# Altium schematic symbol library 13-Logic 数字 IC.SchLib: 324 symbols (part 3 of 30) (continued)
## 5AGXMB1G4F40C4N_Pin Name Avec Pin Number (continued)
part H pins: A20 IO_8D_A20/FPLL_TC_CLKOUT2,FPLL_TC_FBP,FPLL_TC_FB1/DIFFIO_RX_T89P/DQS12T/CQ12T/CQN12T/QKN12T (io), A23 IO_8D_A23/DIFFIO_TX_T95P/DQ13T (io), A24 IO_8D_A24/DIFFIO_TX_T95N (io), A25 IO_8C_A25/DIFFIO_RX_T112P/DQS15T/CQ15T/CQN15T/QKN15T (io), A26 IO_8C_A26/DIFFIO_TX_T118P/DQ16T (io), A27 IO_8C_A27/DIFFIO_TX_T118N (io), B21 IO_8D_B21/FPLL_TC_CLKOUT3,FPLL_TC_FBN/DIFFIO_RX_T89N/DQSN12T/QK12T (io), B24 IO_8D_B24/DIFFIO_RX_T102P/DQ14T (io), B25 IO_8C_B25/DIFFIO_RX_T112N/DQSN15T/QK15T (io), B27 IO_8C_B27/DIFFIO_RX_T125P/DQ17T (io), C23 IO_8D_C23/DIFFIO_RX_T96P/DQS13T/CQ13T/CQN13T/QKN13T (io), C24 IO_8D_C24/DIFFIO_RX_T102N/DQ14T (io), C26 IO_8C_C26/DIFFIO_RX_T116P/DQ16T (io), C27 IO_8C_C27/DIFFIO_RX_T125N/DQ17T (io), D21 IO_8D_D21/DIFFIO_TX_T88P/DQ12T (io), D23 IO_8D_D23/DIFFIO_RX_T96N/DQSN13T/QK13T (io), D24 IO_8D_D24/DIFFIO_RX_T104P/DQS14T/CQ14T/CQN14T/QKN14T (io), D25 IO_8C_D25/DIFFIO_RX_T114P/DQ15T (io), D26 IO_8C_D26/DIFFIO_RX_T116N/DQ16T (io), E21 IO_8D_E21/DIFFIO_TX_T88N (io), E22 IO_8D_E22/DIFFIO_RX_T94P/DQ13T (io), E24 IO_8D_E24/DIFFIO_RX_T104N/DQSN14T/QK14T (io), E25 IO_8C_E25/DIFFIO_RX_T114N/DQ15T (io), E27 IO_8C_E27/DIFFIO_TX_T126P/DQ17T (io), F22 IO_8D_F22/DIFFIO_RX_T94N/DQ13T (io), F23 IO_8D_F23/DIFFIO_RX_T100P/DQ14T (io), F24 IO_8D_F24/DIFFIO_RX_T106P/DQ14T (io), F26 IO_8C_F26/DIFFIO_RX_T121P/DQ16T (io), F27 IO_8C_F27/DIFFIO_TX_T126N (io), G23 IO_8D_G23/DIFFIO_RX_T100N/DQ14T (io), G24 IO_8D_G24/DIFFIO_RX_T106N/DQ14T (io), G25 IO_8C_G25/DIFFIO_TX_T109P/DQ15T (io), G26 IO_8C_G26/DIFFIO_RX_T121N/DQ16T (io), H24 IO_8D_H24/DIFFIO_TX_T107P/DQ14T (io), H25 IO_8C_H25/DIFFIO_TX_T109N (io), H27 IO_8C_H27/DIFFIO_TX_T124P/DQ17T (io), J21 IO_8D_J21/FPLL_TC_CLKOUT0,FPLL_TC_CLKOUTP,FPLL_TC_FB0/DIFFIO_TX_T90P/DQ12T (io), J22 IO_8D_J22/DQ13T (io), J23 IO_8D_J23/DIFFIO_TX_T105P/DQ14T (io), J24 IO_8D_J24/DIFFIO_TX_T107N (io), J26 IO_8C_J26/DIFFIO_TX_T120P/DQ16T (io), J27 IO_8C_J27/DIFFIO_TX_T124N (io), K21 IO_8D_K21/FPLL_TC_CLKOUT1,FPLL_TC_CLKOUTN/DIFFIO_TX_T90N (io), K23 IO_8D_K23/DIFFIO_TX_T105N (io), K24 IO_8C_K24/DIFFIO_TX_T113P/DQ15T (io), K25 IO_8C_K25/DQ16T (io), K26 IO_8C_K26/DIFFIO_TX_T120N (io), K27 IO_8C_K27/DIFFIO_TX_T128P/DQ17T (io), L22 IO_8D_L22/DIFFIO_TX_T97P/DQ13T (io), L24 IO_8C_L24/DIFFIO_TX_T113N (io), L27 IO_8C_L27/DIFFIO_TX_T128N (io), M21 IO_8D_M21/DIFFIO_TX_T86P/DQ12T (io), M22 IO_8D_M22/DIFFIO_TX_T97N (io), M23 IO_8D_M23/DIFFIO_TX_T103P/DQ14T (io), M25 IO_8C_M25/DIFFIO_TX_T122P/DQ16T (io), M26 IO_8C_M26/DIFFIO_RX_T119P/DQS16T/CQ16T/CQN16T/QKN16T (io), M27 IO_8C_M27/DIFFIO_RX_T129P/DQ17T (io), N21 IO_8D_N21/DIFFIO_TX_T86N (io), N22 IO_8D_N22/DIFFIO_RX_T98P/DQ13T (io), N23 IO_8D_N23/DIFFIO_TX_T103N (io), N24 IO_8C_N24/DIFFIO_RX_T110P/DQ15T (io), N25 IO_8C_N25/DIFFIO_TX_T122N (io), N26 IO_8C_N26/DIFFIO_RX_T119N/DQSN16T/QK16T (io), N27 IO_8C_N27/DIFFIO_RX_T129N/DQ17T (io), N28 IO_8C_N28/DIFFIO_TX_T130P/DQ17T (io), P22 IO_8D_P22/DIFFIO_RX_T98N/DQ13T (io), P24 IO_8C_P24/DIFFIO_RX_T110N/DQ15T (io), P25 IO_8C_P25/DIFFIO_TX_T115P/DQ15T (io), P27 IO_8C_P27/DIFFIO_RX_T123P/DQ17T (io), P28 IO_8C_P28/DIFFIO_TX_T130N (io), R21 IO_8D_R21/DIFFIO_TX_T92P/DQ12T (io), R22 IO_8D_R22/DIFFIO_TX_T99P/DQ13T (io), R23 IO_8D_R23/DIFFIO_TX_T101P/DQ14T (io), R24 IO_8C_R24/DIFFIO_TX_T111P/DQ15T (io), R25 IO_8C_R25/DIFFIO_TX_T115N (io), R26 IO_8C_R26/DIFFIO_RX_T117P/DQ16T (io), R27 IO_8C_R27/DIFFIO_RX_T123N/DQ17T (io), R28 IO_8C_R28/DIFFIO_RX_T127P/DQS17T/CQ17T/CQN17T/QKN17T (io), T21 IO_8D_T21/DIFFIO_TX_T92N (io), T22 IO_8D_T22/DIFFIO_TX_T99N (io), T23 IO_8D_T23/DIFFIO_TX_T101N (io), T24 IO_8C_T24/DIFFIO_TX_T111N (io), T25 IO_8C_T25/DIFFIO_RX_T108N/DQ15T (io), T26 IO_8C_T26/DIFFIO_RX_T108P/DQ15T (io), T27 IO_8C_T27/DIFFIO_RX_T117N/DQ16T (io), T28 IO_8C_T28/DIFFIO_RX_T127N/DQSN17T/QK17T (io)
part I pins: AF18 VREFB4DN0 (io), AG15 VREFB4CN0 (io), AH7 VREFB4AN0 (io), AJ21 VREFB3DN0 (io), AJ31 VREFB3AN0 (io), AK26 VREFB3CN0 (io), AL28 VREFB3BN0 (io), AN11 VREFB4BN0 (io), D15 VREFB7CN0 (io), G11 VREFB7BN0 (io), H22 VREFB8DN0 (io), H33 VREFB8AN0 (io), J7 VREFB7AN0 (io), L25 VREFB8CN0 (io), R31 VREFB8BN0 (io), T18 VREFB7DN0 (io)
part J pins: A6 CLK13P_A6/DIFFIO_RX_T3P/DQ1T (io), A21 CLK17N_A21/DIFFIO_RX_T91N/DQ12T (io), A22 CLK17P_A22/DIFFIO_RX_T91P/DQ12T (io), AC21 CLK6N_AC21/DIFFIO_RX_B82N/DQ11B (io), AD20 CLK6P_AD20/DIFFIO_RX_B82P/DQ11B (io), AE21 CLK5N_AE21/DIFFIO_RX_B78N/DQ11B (io), AF21 CLK5P_AF21/DIFFIO_RX_B78P/DQ11B (io), AJ7 CLK11N_AJ7/DIFFIO_RX_B160N/DQ21B (io), AJ34 CLK1N_AJ34/DIFFIO_RX_B4N/DQSN1B/QK1B (io), AK7 CLK11P_AK7/DIFFIO_RX_B160P/DQ21B (io), AK20 CLK7N_AK20/DIFFIO_RX_B84N/DQ11B (io), AK34 CLK1P_AK34/DIFFIO_RX_B4P/DQS1B/CQ1B/CQN1B/QKN1B (io), AL20 CLK7P_AL20/DIFFIO_RX_B84P/DQ11B (io), AL33 CLK2N_AL33/DIFFIO_RX_B7N/DQ1B (io), AM33 CLK2P_AM33/DIFFIO_RX_B7P/DQ1B (io), AN34 CLK0N_AN34/DIFFIO_RX_B2N/DQ1B (io), AP6 CLK8N_AP6/DIFFIO_RX_B168N/DQ22B (io), AP34 CLK0P_AP34/DIFFIO_RX_B2P/DQ1B (io), AR6 CLK8P_AR6/DIFFIO_RX_B168P/DQ22B (io), AR7 CLK10N_AR7/DIFFIO_RX_B164N/DQSN22B/QK22B (io), AT7 CLK10P_AT7/DIFFIO_RX_B164P/DQS22B/CQ22B/CQN22B/QKN22B (io), AT32 CLK3N_AT32/DIFFIO_RX_B9N/DQ2B (io), AU19 CLK4N_AU19/DIFFIO_RX_B76N/DQ10B (io), AU32 CLK3P_AU32/DIFFIO_RX_B9P/DQ2B (io), AV4 CLK9N_AV4/DIFFIO_RX_B166N/DQ22B (io), AV19 CLK4P_AV19/DIFFIO_RX_B76P/DQ10B (io), AW4 CLK9P_AW4/DIFFIO_RX_B166P/DQ22B (io), B6 CLK13N_B6/DIFFIO_RX_T3N/DQ1T (io), B22 CLK16P_B22/DIFFIO_RX_T93P/DQ13T (io), C6 CLK12P_C6/DIFFIO_RX_T1P/DQ1T (io), C20 CLK19P_C20/DIFFIO_RX_T85P/DQ12T (io), C22 CLK16N_C22/DIFFIO_RX_T93N/DQ13T (io), C34 CLK20P_C34/DIFFIO_RX_T167P/DQ22T (io), D6 CLK12N_D6/DIFFIO_RX_T1N/DQ1T (io), D20 CLK19N_D20/DIFFIO_RX_T85N/DQ12T (io), D34 CLK20N_D34/DIFFIO_RX_T167N/DQ22T (io), E6 CLK14P_E6/DIFFIO_RX_T5P/DQS1T/CQ1T/CQN1T/QKN1T (io), E7 CLK14N_E7/DIFFIO_RX_T5N/DQSN1T/QK1T (io), E34 CLK22P_E34/DIFFIO_RX_T162P/DQ22T (io), F34 CLK22N_F34/DIFFIO_RX_T162N/DQ22T (io), G21 CLK18P_G21/DIFFIO_RX_T87P/DQ12T (io), G34 CLK21P_G34/DIFFIO_RX_T165P/DQS22T/CQ22T/CQN22T/QKN22T (io), H6 CLK15P_H6/DIFFIO_RX_T9P/DQ2T (io), H21 CLK18N_H21/DIFFIO_RX_T87N/DQ12T (io), H34 CLK21N_H34/DIFFIO_RX_T165N/DQSN22T/QK22T (io), J6 CLK15N_J6/DIFFIO_RX_T9N/DQ2T (io), N33 CLK23N_N33/DIFFIO_RX_T160N/DQ21T (io), N34 CLK23P_N34/DIFFIO_RX_T160P/DQ21T (io)
part K pins: A34 MSEL1 (io), A36 NCONFIG (io), A37 MSEL3 (io), AE11 4A_DATA6/DIFFIO_RX_B155P/DQ21B (io), AF10 4A_DATA5/DIFFIO_RX_B155N/DQ21B (io), AH6 4A_DATA7/DIFFIO_RX_B157N/DQSN21B/QK21B (io), AH9 4A_DATA14/DIFFIO_TX_B158N (io), AH10 4A_DATA10/DIFFIO_TX_B154N (io), AJ6 4A_DATA8/DIFFIO_RX_B157P4A_/DQS21B/CQ21B/CQN21B/QKN21B (io), AJ9 4A_DATA15/DIFFIO_TX_B158P/DQ21B (io), AJ10 4A_DATA11/DIFFIO_TX_B154P/DQ21B (io), AK6 4A_DATA12/DIFFIO_TX_B156N (io), AL6 4A_DATA13/DIFFIO_TX_B156P/DQ21B (io), AM6 4A_DATA9/DIFFIO_RX_B159N/DQ21B (io), AM35 TMS (io), AN6 CLKUSR/DIFFIO_RX_B159P/DQ21B (io), AR33 3A_AS_DATA2/DATA2 (io), AR34 3A_NCSO/DATA4 (io), AT33 TDI (io), AT34 TDO (io), AU33 3A_AS_DATA1/DATA1 (io), AU34 3A_AS_DATA3/DATA3 (io), AV33 3A_AS_DATA0,ASDO/DATA0 (io), AV34 TCK (io), AW34 DCLK (io), D35 MSEL2 (io), F35 NSTATUS (io), H35 MSEL0 (io), K6 DEV_OE/DIFFIO_RX_T10P/DQ2T (io), K35 CONF_DONE (io), L6 DEV_CLRN/DIFFIO_RX_T10N/DQ2T (io), L7 PR_DONE/DIFFIO_TX_T13P/DQ2T (io), L10 PR_ERROR/DIFFIO_TX_T15P/DQ2T (io), M6 PR_REQUEST/DIFFIO_TX_T13N (io), M7 INIT_DONE/DIFFIO_RX_T14P/DQ2T (io), M10 PR_READY/DIFFIO_TX_T15N (io), M35 NCE (io), N7 NCEO/DIFFIO_RX_T14N/DQ2T (io), N9 NPERSTL0/DIFFIO_TX_T11N (io), P9 CRC_ERROR/DIFFIO_RX_T12N/DQSN2T/QK2T (io), P10 CVP_CONFDONE/DIFFIO_RX_T12P/DQS2T/CQ2T/CQN2T/QKN2T (io), P34 MSEL4 (io)
part L pins: AA1 GXB_RX_R8P,GXB_REFCLK_R8P (io), AA2 GXB_RX_R8N,GXB_REFCLK_R8N (io), AA36 GXB_TX_L8N (io), AA37 GXB_TX_L8P (io), AB3 GXB_TX_R7P (io), AB4 GXB_TX_R7N (io), AB8 REFCLK2RN (io), AB9 REFCLK2RP (io), AB38 GXB_RX_L8N,GXB_REFCLK_L8N (io), AB39 GXB_RX_L8P,GXB_REFCLK_L8P (io), AC1 GXB_RX_R7P,GXB_REFCLK_R7P (io), AC2 GXB_RX_R7N,GXB_REFCLK_R7N (io), AC31 REFCLK2LP (io), AC32 REFCLK2LN (io), AC36 GXB_TX_L7N (io), AC37 GXB_TX_L7P (io), AD3 GXB_TX_R6P (io), AD4 GXB_TX_R6N (io), AD38 GXB_RX_L7N,GXB_REFCLK_L7N (io), AD39 GXB_RX_L7P,GXB_REFCLK_L7P (io), AE1 GXB_RX_R6P,GXB_REFCLK_R6P (io), AE2 GXB_RX_R6N,GXB_REFCLK_R6N (io), AE31 REFCLK1LP (io), AE32 REFCLK1LN (io), AE36 GXB_TX_L6N (io), AE37 GXB_TX_L6P (io), AF7 REFCLK0RN (io), AF8 REFCLK0RP (io), AF38 GXB_RX_L6N,GXB_REFCLK_L6N (io), AF39 GXB_RX_L6P,GXB_REFCLK_L6P (io), AG32 REFCLK0LP (io), AG33 REFCLK0LN (io), AG36 GXB_TX_L5N (io), AG37 GXB_TX_L5P (io), AH38 GXB_RX_L5N,GXB_REFCLK_L5N (io), AH39 GXB_RX_L5P,GXB_REFCLK_L5P (io), AJ36 GXB_TX_L4N (io), AJ37 GXB_TX_L4P (io), AK38 GXB_RX_L4N,GXB_REFCLK_L4N (io), AK39 GXB_RX_L4P,GXB_REFCLK_L4P (io), AL36 GXB_TX_L3N (io), AL37 GXB_TX_L3P (io), AM3 GXB_TX_R2P (io), AM4 GXB_TX_R2N (io), AM38 GXB_RX_L3N,GXB_REFCLK_L3N (io), AM39 GXB_RX_L3P,GXB_REFCLK_L3P (io), AN1 GXB_RX_R2P,GXB_REFCLK_R2P (io), AN2 GXB_RX_R2N,GXB_REFCLK_R2N (io), AN36 GXB_TX_L2N (io), AN37 GXB_TX_L2P (io), AP3 GXB_TX_R1P (io), AP4 GXB_TX_R1N (io), AP38 GXB_RX_L2N,GXB_REFCLK_L2N (io), AP39 GXB_RX_L2P,GXB_REFCLK_L2P (io), AR1 GXB_RX_R1P,GXB_REFCLK_R1P (io), AR2 GXB_RX_R1N,GXB_REFCLK_R1N (io), AR36 GXB_TX_L1N (io), AR37 GXB_TX_L1P (io), AT3 GXB_TX_R0P (io), AT4 GXB_TX_R0N (io), AT38 GXB_RX_L1N,GXB_REFCLK_L1N (io), AT39 GXB_RX_L1P,GXB_REFCLK_L1P (io), AU1 GXB_RX_R0P,GXB_REFCLK_R0P (io), AU2 GXB_RX_R0N,GXB_REFCLK_R0N (io), AU36 GXB_TX_L0N (io), AU37 GXB_TX_L0P (io), AW2 RREF_BR (io), AW36 GXB_RX_L0N,GXB_REFCLK_L0N (io), AW37 GXB_RX_L0P,GXB_REFCLK_L0P (io), B39 RREF_TL (io), P3 GXB_TX_R11P (io), P4 GXB_TX_R11N (io), R1 GXB_RX_R11P,GXB_REFCLK_R11P (io), R2 GXB_RX_R11N,GXB_REFCLK_R11N (io), T3 GXB_TX_R10P (io), T4 GXB_TX_R10N (io), U1 GXB_RX_R10P,GXB_REFCLK_R10P (io), U2 GXB_RX_R10N,GXB_REFCLK_R10N (io), V3 GXB_TX_R9P (io), V4 GXB_TX_R9N (io), W1 GXB_RX_R9P,GXB_REFCLK_R9P (io), W2 GXB_RX_R9N,GXB_REFCLK_R9N (io), Y3 GXB_TX_R8P (io), Y4 GXB_TX_R8N (io), Y8 REFCLK3RN (io), Y9 REFCLK3RP (io)
part M pins: AG10 VCCIO4A (power), AH29 VCCIO3A (power), AJ5 VCCIO4A (power), AJ15 VCCIO4C (power), AJ19 VCCIO4D (power), AJ22 VCCIO3D (power), AJ24 VCCIO3C (power), AJ30 VCCIO3A (power), AK13 VCCIO4B (power), AK18 VCCIO4D (power), AK28 VCCIO3B (power), AK35 VCCIO3A (power), AL5 VCCIO4A (power), AL21 VCCIO3D (power), AL25 VCCIO3C (power), AL27 VCCIO3B (power), AM12 VCCIO4B (power), AM15 VCCIO4C (power), AM19 VCCIO4D (power), AM22 VCCIO3D (power), AM24 VCCIO3C (power), AM30 VCCIO3A (power), AN5 VCCIO4A (power), AN10 VCCIO4B (power), AN13 VCCIO4B (power), AN18 VCCIO4D (power), AN28 VCCIO3B (power), AP21 VCCIO3D (power), AP25 VCCIO3C (power), AP35 VCCIO3A (power), AR5 VCCIO4A (power), AR12 VCCIO4B (power), AR15 VCCIO4C (power), AR19 VCCIO4D (power), AR22 VCCIO3D (power), AR24 VCCIO3C (power), AT10 VCCIO4B (power), AT18 VCCIO4D (power), AT28 VCCIO3B (power), AT35 VCCIO3A (power), AU5 VCCIO4A (power), AU21 VCCIO3D (power), AU25 VCCIO3C (power), AV15 VCCIO4C (power), B19 VCCIO7D (power), B35 VCCIO8A (power), C13 VCCIO7B (power), C21 VCCIO8D (power), C25 VCCIO8C (power), D10 VCCIO7B (power), D18 VCCIO7D (power), D22 VCCIO8D (power), D27 VCCIO8C (power), E5 VCCIO7A (power), E19 VCCIO7D (power), E28 VCCIO8B (power), E30 VCCIO8B (power), F13 VCCIO7B (power), F16 VCCIO7C (power), F21 VCCIO8D (power), F25 VCCIO8C (power), G5 VCCIO7A (power), G10 VCCIO7B (power), G15 VCCIO7C (power), G18 VCCIO7D (power), G22 VCCIO8D (power), G27 VCCIO8C (power), G31 VCCIO8A (power), G33 VCCIO8A (power), H7 VCCIO7A (power), H19 VCCIO7D (power), H30 VCCIO8B (power), J5 VCCIO7A (power), J25 VCCIO8C (power), K10 VCCIO7B (power), K15 VCCIO7C (power), K22 VCCIO8D (power), K28 VCCIO8B (power), K31 VCCIO8A (power), K33 VCCIO8A (power), L5 VCCIO7A (power), L13 VCCIO7B (power), L16 VCCIO7C (power), L21 VCCIO8D (power), M9 VCCIO7A (power), M18 VCCIO7D (power), M24 VCCIO8C (power), P33 VCCIO8A (power)
part N pins: AA10 VCC (power), AA12 VCC (power), AA14 VCC (power), AA16 VCC (power), AA18 VCC (power), AA20 VCC (power), AA21 VCCP (power), AA22 VCC (power), AA24 VCC (power), AA25 VCCP (power), AA26 VCC (power), AA27 VCCPD3 (power), AA28 VCCPD3 (power), AA29 VCCPD3 (power), AB11 VCC (power), AB12 VCCPD4BCD (power), AB13 VCCPD4BCD (power), AB14 VCC_AUX (power), AB15 VCCP (power), AB16 VCCPD4BCD (power), AB17 VCC (power), AB18 VCCPD4BCD (power), AB19 VCCPD4BCD (power), AB22 VCCPD3 (power), AB23 VCCPD3 (power), AB24 VCCPD3 (power), AB26 VCC_AUX (power), AB30 VCCPD3 (power), AC10 VCCPD4A (power), AE10 VCCPD4A (power), AG29 VCCPGM (power), N11 VCCPGM (power), P8 VCCPD7A (power), R10 VCCPD7A (power), R32 VCCPD8 (power), R33 VCCBAT (power), T12 VCCPD7BCD (power), T13 VCCPD7BCD (power), T16 VCCPD7BCD (power), T30 VCCPD8 (power), U10 VCC (power), U12 VCC (power), U14 VCC_AUX (power), U16 VCCP (power), U18 VCCPD7BCD (power), U19 VCCPD7BCD (power), U21 VCCPD8 (power), U22 VCCPD8 (power), U24 VCCPD8 (power), U26 VCCPD8 (power), U28 VCC_AUX (power), U29 VCCPD8 (power), V11 VCC (power), V13 VCCP (power), V15 VCC (power), V17 VCC (power), V22 VCCP (power), V23 VCC (power), V25 VCCP (power), V27 VCCP (power), V29 VCC (power), W10 VCC (power), W12 VCC (power), W14 VCC (power), W16 VCC (power), W18 VCC (power), W20 VCC (power), W22 VCC (power), W24 VCC (power), W26 VCC (power), W28 VCC (power), Y11 VCC (power), Y13 VCCP (power), Y15 VCC (power), Y17 VCC (power), Y19 VCC (power), Y21 VCC (power), Y23 VCC (power), Y25 VCC (power), Y27 VCCP (power), Y29 VCC (power)
part O pins: AA5 VCCT_GXBR1 (power), AA7 VCCA_GXBR1 (power), AA9 VCCA_FPLL (power), AA34 VCCT_GXBL1 (power), AB5 VCCR_GXBR (power), AB6 VCCR_GXBR (power), AB20 VCCD_FPLL (power), AB21 VCCA_FPLL (power), AB33 VCCA_GXBL1 (power), AB35 VCCT_GXBL1 (power), AC5 VCCL_GXBR0 (power), AC6 VCCL_GXBR0 (power), AC7 VCCH_GXBR0 (power), AC9 VCCA_FPLL (power), AC30 VCCA_FPLL (power), AC34 VCCR_GXBL (power), AC35 VCCR_GXBL (power), AD6 VCCT_GXBR0 (power), AD31 VCCD_FPLL (power), AD33 VCCH_GXBL0 (power), AD34 VCCL_GXBL0 (power), AD35 VCCL_GXBL0 (power), AE5 VCCT_GXBR0 (power), AE7 VCCA_GXBR0 (power), AE9 VCCD_FPLL (power), AE34 VCCT_GXBL0 (power), AF5 VCCR_GXBR (power), AF6 VCCR_GXBR (power), AF33 VCCA_GXBL0 (power), AF35 VCCT_GXBL0 (power), AG34 VCCR_GXBL (power), AG35 VCCR_GXBL (power), P5 VCCR_GXBR (power), R5 VCCL_GXBR2 (power), R6 VCCL_GXBR2 (power), R7 VCCH_GXBR2 (power), R9 VCCD_FPLL (power), R35 VCCR_GXBL (power), T6 VCCT_GXBR2 (power), T31 VCCD_FPLL (power), T33 VCCH_GXBL2 (power), T34 VCCL_GXBL2 (power), T35 VCCL_GXBL2 (power), U5 VCCT_GXBR2 (power), U7 VCCA_GXBR2 (power), U9 VCCA_FPLL (power), U34 VCCT_GXBL2 (power), V5 VCCR_GXBR (power), V6 VCCR_GXBR (power), V19 VCCD_FPLL (power), V20 VCCA_FPLL (power), V31 VCCA_FPLL (power), V33 VCCA_GXBL2 (power), V35 VCCT_GXBL2 (power), W5 VCCL_GXBR1 (power), W6 VCCL_GXBR1 (power), W7 VCCH_GXBR1 (power), W9 VCCD_FPLL (power), W30 VCCD_FPLL (power), W34 VCCR_GXBL (power), W35 VCCR_GXBL (power), Y6 VCCT_GXBR1 (power), Y30 VCCA_FPLL (power), Y33 VCCH_GXBL1 (power), Y34 VCCL_GXBL1 (power), Y35 VCCL_GXBL1 (power)
part P pins: A2 GND (power), A3 GND (power), A4 GND (power), A5 GND (power), AA3 GND (power), AA4 GND (power), AA6 GND (power), AA8 GND (power), AA11 GND (power), AA13 GND (power), AA15 GND (power), AA17 GND (power), AA19 GND (power), AA23 GND (power), AA30 GND (power), AA31 GND (power), AA32 GND (power), AA33 GND (power), AA35 GND (power), AA38 GND (power), AA39 GND (power), AB1 GND (power), AB2 GND (power), AB7 GND (power), AB10 GND (power), AB31 GND (power), AB32 GND (power), AB34 GND (power), AB36 GND (power), AB37 GND (power), AC3 GND (power), AC4 GND (power), AC8 GND (power), AC11 GND (power), AC14 GND (power), AC17 GND (power), AC20 GND (power), AC23 GND (power), AC26 GND (power), AC28 GND (power), AC33 GND (power), AC38 GND (power), AC39 GND (power), AD1 GND (power), AD2 GND (power), AD5 GND (power), AD7 GND (power), AD8 GND (power), AD9 GND (power), AD10 GND (power), AD30 GND (power), AD32 GND (power), AD36 GND (power), AD37 GND (power), AE3 GND (power), AE4 GND (power), AE6 GND (power), AE8 GND (power), AE30 GND (power), AE33 GND (power), AE35 GND (power), AE38 GND (power), AE39 GND (power), AF1 GND (power), AF2 GND (power), AF9 GND (power), AF11 GND (power), AF14 GND (power), AF17 GND (power), AF20 GND (power), AF23 GND (power), AF26 GND (power), AF29 GND (power), AF30 GND (power), AF31 GND (power), AF32 GND (power), AF34 GND (power), AF36 GND (power), AF37 GND (power), AG1 GND (power), AG2 GND (power), AG3 GND (power), AG4 GND (power), AG5 GND (power), AG6 GND (power), AG7 GND (power), AG8 GND (power), AG9 GND (power), AG31 GND (power), AG38 GND (power), AG39 GND (power), AH1 GND (power), AH2 GND (power), AH5 GND (power), AH32 GND (power), AH33 GND (power), AH34 GND (power), AH35 GND (power), AH36 GND (power), AH37 GND (power), AJ1 GND (power), AJ2 GND (power), AJ3 GND (power), AJ4 GND (power), AJ8 GND (power), AJ11 GND (power), AJ14 GND (power), AJ17 GND (power), AJ20 GND (power), AJ23 GND (power), AJ26 GND (power), AJ29 GND (power), AJ32 GND (power), AJ35 GND (power), AJ38 GND (power), AJ39 GND (power), AK1 GND (power), AK2 GND (power), AK5 GND (power), AK36 GND (power), AK37 GND (power), AL1 GND (power), AL2 GND (power), AL3 GND (power), AL4 GND (power), AL35 GND (power), AL38 GND (power), AL39 GND (power), AM1 GND (power), AM2 GND (power), AM5 GND (power), AM8 GND (power), AM11 GND (power), AM14 GND (power), AM17 GND (power), AM20 GND (power), AM23 GND (power), AM26 GND (power), AM29 GND (power), AM32 GND (power), AM36 GND (power), AM37 GND (power), AN3 GND (power), AN4 GND (power), AN35 GND (power), AN38 GND (power), AN39 GND (power), AP1 GND (power), AP2 GND (power), AP5 GND (power), AP36 GND (power), AP37 GND (power), AR3 GND (power), AR4 GND (power), AR8 GND (power), AR11 GND (power), AR14 GND (power), AR17 GND (power), AR20 GND (power), AR23 GND (power), AR26 GND (power), AR29 GND (power), AR32 GND (power), AR35 GND (power), AR38 GND (power), AR39 GND (power), AT1 GND (power), AT2 GND (power), AT5 GND (power), AT36 GND (power), AT37 GND (power), AU3 GND (power), AU4 GND (power), AU35 GND (power), AU38 GND (power), AU39 GND (power), AV1 GND (power), AV2 GND (power), AV5 GND (power), AV8 GND (power), AV11 GND (power), AV14 GND (power), AV17 GND (power), AV20 GND (power), AV23 GND (power), AV26 GND (power), AV29 GND (power), AV32 GND (power), AV35 GND (power), AV36 GND (power), AV37 GND (power), AV38 GND (power), AV39 GND (power), AW35 GND (power), AW38 GND (power), B1 GND (power), B2 GND (power), B5 GND (power), B8 GND (power), B11 GND (power), B14 GND (power), B17 GND (power), B20 GND (power), B23 GND (power), B26 GND (power), B29 GND (power), B32 GND (power), B36 GND (power), B37 GND (power), C1 GND (power), C2 GND (power), C3 GND (power), C4 GND (power), C35 GND (power), C38 GND (power), C39 GND (power)
part Q pins: D1 GND (power), D2 GND (power), D5 GND (power), D36 GND (power), D37 GND (power), D38 GND (power), D39 GND (power), E1 GND (power), E2 GND (power), E3 GND (power), E4 GND (power), E8 GND (power), E11 GND (power), E14 GND (power), E17 GND (power), E20 GND (power), E23 GND (power), E26 GND (power), E29 GND (power), E32 GND (power), E35 GND (power), E38 GND (power), E39 GND (power), F1 GND (power), F2 GND (power), F5 GND (power), F36 GND (power), F37 GND (power), F38 GND (power), F39 GND (power), G1 GND (power), G2 GND (power), G3 GND (power), G4 GND (power), G35 GND (power), G38 GND (power), G39 GND (power), H1 GND (power), H2 GND (power), H5 GND (power), H8 GND (power), H11 GND (power), H14 GND (power), H17 GND (power), H20 GND (power), H23 GND (power), H26 GND (power), H29 GND (power), H32 GND (power), H36 GND (power), H37 GND (power), H38 GND (power), H39 GND (power), J1 GND (power), J2 GND (power), J3 GND (power), J4 GND (power), J35 GND (power), J38 GND (power), J39 GND (power), K1 GND (power), K2 GND (power), K5 GND (power), K36 GND (power), K37 GND (power), K38 GND (power), K39 GND (power), L1 GND (power), L2 GND (power), L3 GND (power), L4 GND (power), L8 GND (power), L11 GND (power), L14 GND (power), L17 GND (power), L20 GND (power), L23 GND (power), L26 GND (power), L29 GND (power), L32 GND (power), L35 GND (power), L38 GND (power), L39 GND (power), M1 GND (power), M2 GND (power), M5 GND (power), M36 GND (power), M37 GND (power), M38 GND (power), M39 GND (power), N1 GND (power), N2 GND (power), N3 GND (power), N4 GND (power), N5 GND (power), N6 GND (power), N8 GND (power), N35 GND (power), N38 GND (power), N39 GND (power), P1 GND (power), P2 GND (power), P6 GND (power), P7 GND (power), P11 GND (power), P14 GND (power), P17 GND (power), P20 GND (power), P23 GND (power), P26 GND (power), P29 GND (power), P32 GND (power), P35 GND (power), P36 GND (power), P37 GND (power), P38 GND (power), P39 GND (power), R3 GND (power), R4 GND (power), R8 GND (power), R34 GND (power), R38 GND (power), R39 GND (power), T1 GND (power), T2 GND (power), T5 GND (power), T7 GND (power), T8 GND (power), T9 GND (power), T10 GND (power), T32 GND (power), T36 GND (power), T37 GND (power), T38 GND (power), T39 GND (power), U3 GND (power), U4 GND (power), U6 GND (power), U8 GND (power), U11 GND (power), U13 GND (power), U15 GND (power), U17 GND (power), U20 GND (power), U23 GND (power), U25 GND (power), U27 GND (power), U30 GND (power), U31 GND (power), U32 GND (power), U33 GND (power), U35 GND (power), U38 GND (power), U39 GND (power), V1 GND (power), V2 GND (power), V7 GND (power), V8 GND (power), V9 GND (power), V10 GND (power), V12 GND (power), V14 GND (power), V16 GND (power), V18 GND (power), V21 GND (power), V24 GND (power), V26 GND (power), V28 GND (power), V30 GND (power), V32 GND (power), V34 GND (power), V36 GND (power), V37 GND (power), V38 GND (power), V39 GND (power), W3 GND (power), W4 GND (power), W8 GND (power), W11 GND (power), W13 GND (power), W15 GND (power), W17 GND (power), W19 GND (power), W21 GND (power), W23 GND (power), W25 GND (power), W27 GND (power), W29 GND (power), W31 GND (power), W32 GND (power), W33 GND (power), W38 GND (power), W39 GND (power), Y1 GND (power), Y2 GND (power), Y5 GND (power), Y7 GND (power), Y10 GND (power), Y12 GND (power), Y14 GND (power), Y16 GND (power), Y18 GND (power), Y20 GND (power), Y22 GND (power), Y24 GND (power), Y26 GND (power), Y28 GND (power), Y31 GND (power), Y32 GND (power), Y36 GND (power), Y37 GND (power), Y38 GND (power), Y39 GND (power)
part R pins: A38 DNU (io), AE20 DNU (io), AF3 DNU (io), AF4 DNU (io), AH3 DNU (io), AH4 DNU (io), AH31 DNU (io), AK3 DNU (io), AK4 DNU (io), AV3 DNU (io), AW3 DNU (io), B3 DNU (io), B4 DNU (io), B38 DNU (io), C5 DNU (io), C36 DNU (io), C37 DNU (io), D3 DNU (io), D4 DNU (io), E36 DNU (io), E37 DNU (io), F3 DNU (io), F4 DNU (io), G36 DNU (io), G37 DNU (io), H3 DNU (io), H4 DNU (io), J36 DNU (io), J37 DNU (io), K3 DNU (io), K4 DNU (io), L36 DNU (io), L37 DNU (io), M3 DNU (io), M4 DNU (io), N36 DNU (io), N37 DNU (io), P21 DNU (io), R36 DNU (io), R37 DNU (io), U36 DNU (io), U37 DNU (io), W36 DNU (io), W37 DNU (io)

## 5M1270ZT144C5N
designator IC?
MAX V 1.8V CPLD, 114 IOs, 1270 Logic Elements, 144-Pin TQFP, Commercial Temperature, Speed Grade 5, Pb-Free
part A pins: 1 IO (io), 2 IO, DIFFIO_L1p (io), 3 IO, DIFFIO_L1n (io), 4 IO, DIFFIO_L2p (io), 5 IO, DIFFIO_L2n (io), 6 IO (io), 7 IO, DIFFIO_L3p (io), 8 IO, DIFFIO_L3n (io), 12 IO (io), 13 IO, DIFFIO_L4p (io), 14 IO, DIFFIO_L4n (io), 15 IO, DIFFIO_L5p (io), 16 IO, DIFFIO_L5n (io), 18 IO, CLK0 (io), 20 IO, CLK1 (io), 21 IO, DIFFIO_L6p (io), 22 IO, DIFFIO_L6n (io), 23 IO, DIFFIO_L7p (io), 24 IO, DIFFIO_L7n (io), 27 IO (io), 28 IO (io), 29 IO, DIFFIO_L8p (io), 30 IO, DIFFIO_L8n (io), 31 IO, DIFFIO_L9p (io), 32 IO, DIFFIO_L9n (io)
part B pins: 109 IO, DIFFIO_T9n (io), 110 IO, DIFFIO_T9p (io), 111 IO (io), 112 IO (io), 113 IO (io), 114 IO (io), 117 IO, DIFFIO_T8n (io), 118 IO, DIFFIO_T8p (io), 119 IO (io), 120 IO (io), 121 IO, DIFFIO_T7n (io), 122 IO, DIFFIO_T7p (io), 123 IO, DIFFIO_T6n (io), 124 IO, DIFFIO_T6p (io), 125 IO, DIFFIO_T5n (io), 127 IO, DIFFIO_T5p (io), 129 IO, DIFFIO_T4n (io), 130 IO, DIFFIO_T4p (io), 131 IO (io), 132 IO, DIFFIO_T3n (io), 133 IO, DIFFIO_T3p (io), 134 IO (io), 137 IO (io), 138 IO, DIFFIO_T2n (io), 139 IO, DIFFIO_T2p (io), 140 IO, DIFFIO_T1n (io), 141 IO, DIFFIO_T1p (io), 142 IO (io), 143 IO (io), 144 IO (io)
part C pins: 73 IO, DIFFIO_R12n (io), 74 IO, DIFFIO_R12p (io), 75 IO (io), 76 IO, DIFFIO_R11n (io), 77 IO, DIFFIO_R11p (io), 79 IO, DIFFIO_R10n (io), 80 IO, DIFFIO_R10p (io), 81 IO, DIFFIO_R9n (io), 84 IO, DIFFIO_R9p (io), 85 IO, DIFFIO_R8n (io), 86 IO, DIFFIO_R8p (io), 87 IO, DIFFIO_R7n (io), 88 IO, DIFFIO_R7p (io), 89 IO, CLK2 (io), 91 IO, CLK3 (io), 93 IO, DIFFIO_R6n (io), 94 IO, DIFFIO_R6p (io), 95 IO, DIFFIO_R5n (io), 96 IO, DIFFIO_R5p (io), 97 IO, DIFFIO_R4n (io), 98 IO, DIFFIO_R4p (io), 101 IO, DIFFIO_R3n (io), 102 IO, DIFFIO_R3p (io), 103 IO (io), 104 IO, DIFFIO_R2n (io), 105 IO, DIFFIO_R2p (io), 106 IO, DIFFIO_R1n (io), 107 IO, DIFFIO_R1p (io), 108 IO (io)
part D pins: 37 IO (io), 38 IO, DIFFIO_B1p (io), 39 IO, DIFFIO_B1n (io), 40 IO, DIFFIO_B2p (io), 41 IO, DIFFIO_B2n (io), 42 IO (io), 43 IO, DIFFIO_B3p (io), 44 IO, DIFFIO_B3n (io), 45 IO (io), 48 IO, DIFFIO_B4p (io), 49 IO, DIFFIO_B4n (io), 50 IO, DIFFIO_B5p (io), 51 IO, DIFFIO_B5n (io), 52 IO, DIFFIO_B6p (io), 53 IO, DIFFIO_B6n (io), 55 IO, DIFFIO_B7p (io), 57 IO, DIFFIO_B7n (io), 58 IO, DIFFIO_B8p (io), 59 IO, DIFFIO_B8n (io), 60 IO, DEV_OE, DIFFIO_B9p (io), 61 IO, DEV_CLRn, DIFFIO_B9n (io), 62 IO, DIFFIO_B10p (io), 63 IO, DIFFIO_B10n (io), 66 IO, DIFFIO_B11p (io), 67 IO, DIFFIO_B11n (io), 68 IO (io), 69 IO (io), 70 IO (io), 71 IO, DIFFIO_B12p (io), 72 IO, DIFFIO_B12n (io)
part E pins: 33 TMS (in), 34 TDI (in), 35 TCK (in), 36 TDO (out)
part F pins: 9 VCCIO1 (power), 10 GNDIO (power), 11 GNDIO (power), 17 GNDINT (power), 19 VCCINT (power), 25 VCCIO1 (power), 26 GNDIO (power), 46 VCCIO4 (power), 47 GNDIO (power), 54 GNDINT (power), 56 VCCINT (power), 64 VCCIO4 (power), 65 GNDIO (power), 78 GNDIO (power), 82 VCCIO3 (power), 83 GNDIO (power), 90 VCCINT (power), 92 GNDINT (power), 99 GNDIO (power), 100 VCCIO3 (power), 115 GNDIO (power), 116 VCCIO2 (power), 126 VCCINT (power), 128 GNDINT (power), 135 GNDIO (power), 136 VCCIO2 (power)
part A text: BANK 1
part B text: BANK 2
part C text: BANK 3
part D text: BANK 4

## 24AA64T-I/MC
designator IC?
1.7-5.5V 64K I2C Serial EEPROM
pins: 1 A0 (in), 2 A1 (in), 3 A2 (in), 4 VSS (power), 5 SDA (io), 6 SCL (in), 7 WP (in), 8 VCC (power), 9 EP (power)

## 24AA64T-I/MS
designator IC?
1.7V-5.5V, 64K  (8K x 8-bit) I2C Serial EEPROM
pins: 1 A0 (in), 2 A1 (in), 3 A2 (in), 4 VSS (power), 5 SDA (io), 6 SCL (in), 7 WP (in), 8 VCC (power)

## 24FC64-I/MC
designator IC?
64K I2C Serial EEPROM
pins: 1 A0 (in), 2 A1 (in), 3 A2 (in), 4 VSS (power), 5 SDA (io), 6 SCL (in), 7 WP (in), 8 VCC (power), 9 EP (power)

## 24LC024H-I/SN
designator IC?
2K I2C Serial EEPROM With Half-Array Write Protect
pins: 1 A0 (in), 2 A1 (in), 3 A2 (in), 4 VSS (power), 5 SDA (io), 6 SCL (in), 7 WP (in), 8 VCC (power)